# Altium integrated library Integrated_jp.IntLib: 203 symbols (part 1 of 2) (continued)
## Header 5X2_2
designator P?  Supplier Part Number 1: S6105-ND
10 Position Header Connector 0.100" (2.54mm) Through Hole Tin; LatestRevisionDate: 17-Jul-2002; LatestRevisionNote: Re-released for DXP Platform.; Publisher: Altium Limited; Supplier 1: Digi-Key; ComponentLink1Description: CONN HDR 10POS 0.1 TIN PCB; ComponentLink1URL: https://www.digikey.com/es/products/detail/PPTC052LFBN-RC/S6105-ND/807243?utm_campaign=buynow&utm_medium=aggregator&curr=usd&utm_source=octopart; Link: https://www.digikey.com/es/products/detail/PPTC052LFBN-RC/S6105-ND/807243?utm_campaign=buynow&utm_medium=aggregator&curr=usd&utm_source=octopart; Digi-Key_Part_Number: S6105-ND
signal-integrity model Connector
footprint HDR2X5 (Connector; Header; 5x2 Position)
pins: 1, 2, 3, 4, 5, 6, 7, 8, 9, 10

## Header 6
designator P?  Supplier Part Number 1: 455-2271-ND
Cabezal de conector Orificio pasante 6 posiciones 0.098" (2.50mm); Manufacturer: JST; Manufacturer Part Number: B6BXHA(LF)(SN); Contact Resistance: 20mR; Current Rating: 3A; Voltage Rating (AC): 250V; Number of Positions: 6; Insulation Resistance: 1GR; Connector Type: Male Pin; Wire/Cable Gauge: 22AWG; Pitch: 2.5mm; LatestRevisionDate: 17-Jul-2002; LatestRevisionNote: Re-released for DXP Platform.; Publisher: Altium Limited; Supplier 1: Digi-Key; Stock 1: 28709; Pricing 1: 1=0.27, 10=0.258, 100=0.1808, 500=0.15494, 1000=0.12912, 5000=0.11068, 10000=0.1033 (USD); Mount: Through Hole; Contact Plating: Tin,Lead,Copper; Contact Material: Brass; Color: Natural; Housing Color: White; Housing Material: Polyamide; Min Operating Temperature: -25°C; Max Operating Temperature: 85°C; Package Quantity: 500; Packaging: Bulk; Termination: Press-Fit; Number of Rows: 1; Voltage Rating: 250V; Max Current Rating: 3A; Number of Contacts: 6; Max Voltage Rating (AC): 250V; Max Voltage Rating (DC): 250V; Orientation: Straight; Length: 17.4mm; Depth: 5.75mm; Lead Pitch: 2.5mm; REACH SVHC: No SVHC; Lead Free: Lead Free; ComponentLink1URL: https://www.verical.com/server-webapp/html/getDatasheet?partID=424647&src-supplier=Verical; ComponentLink1Description: https://www.verical.com/server-webapp/html/getDatasheet?partID=424647&src-supplier=Verical; ComponentLink2URL: http://www.rapidonline.com/pdf/523653.pdf?src-supplier=Rapid+Electronics; ComponentLink2Description: http://www.rapidonline.com/pdf/523653.pdf?src-supplier=Rapid+Electronics; ComponentLink3URL: https://www.verical.com/server-webapp/html/getDatasheet?partID=641012&src-supplier=Verical; ComponentLink3Description: https://www.verical.com/server-webapp/html/getDatasheet?partID=641012&src-supplier=Verical; ComponentLink4URL: http://www1.futureelectronics.com/doc/JST/B6B-XH-A(LF)(SN).pdf?src-supplier=Future+Electronics; ComponentLink4Description: http://www1.futureelectronics.com/doc/JST/B6B-XH-A(LF)(SN).pdf?src-supplier=Future+Electronics; ComponentLink5URL: http://www.jst-mfg.com/product/pdf/eng/eXH.pdf?src-supplier=Digi-Key; ComponentLink5Description: http://www.jst-mfg.com/product/pdf/eng/eXH.pdf?src-supplier=Digi-Key; Digi_Key_Part_Number: 455-2271-ND; Link: https://www.digikey.com/es/products/detail/B6B-XH-A(LF)(SN)/455-2271-ND/1000381?utm_campaign=buynow&utm_medium=aggregator&curr=usd&utm_source=octopart; ComponentLink6Description: CONN HEADER VERT 6POS 2.5MM; ComponentLink6URL: https://www.digikey.com/es/products/detail/B6B-XH-A(LF)(SN)/455-2271-ND/1000381?utm_campaign=buynow&utm_medium=aggregator&curr=usd&utm_source=octopart; ComponentLink7Description: CONN HEADER VERT 6POS 2.5MM; ComponentLink7URL: https://www.digikey.com/es/products/detail/jst-sales-america-inc/B6B-XH-A-LF-SN/1000381
footprint HDR1X6 (Connector; Header; 6 Position)
pins: 1, 2, 3, 4, 5, 6

## Header 6X2H
designator P?
Header, 6-Pin, Dual row, Right Angle; LatestRevisionDate: 17-Jul-2002; LatestRevisionNote: Re-released for DXP Platform.; Publisher: Altium Limited
footprint HDR2X6_CEN (Connector; Header; 6x2 Position)
pins: 1, 2, 3, 4, 5, 6, 7, 8, 9, 10, 11, 12

## Header 7X2
designator P?
Header, 7-Pin, Dual row; LatestRevisionDate: 17-Jul-2002; LatestRevisionNote: Re-released for DXP Platform.; Publisher: Altium Limited
signal-integrity model Connector
footprint HDR2X7 (Connector; Header; 7x2 Position)
pins: 1, 2, 3, 4, 5, 6, 7, 8, 9, 10, 11, 12, 13, 14

## HEADER 8X2
designator J?
footprint DISPLAY_BL
pins: 1, 2, 3, 4, 5, 6, 7, 8, 9, 10, 11, 12, 13, 14, 15, 16

## Header 9X2
designator P?
Header, 9-Pin, Dual row; LatestRevisionDate: 17-Jul-2002; LatestRevisionNote: Re-released for DXP Platform.; Publisher: Altium Limited
footprint IDC-2X9
pins: 1, 2, 3, 4, 5, 6, 7, 8, 9, 10, 11, 12, 13, 14, 15, 16, 17, 18

## Header 10
designator P?
10 Position Header Connector 0.079" (2.00mm) Through Hole Gold; Digi_Key_Part_Number: S5751-10-ND; LatestRevisionDate: 17-Jul-2002; LatestRevisionNote: Re-released for DXP Platform.; Publisher: Altium Limited; Link: https://www.digikey.com/en/products/detail/sullins-connector-solutions/NPPN101BFCN-RC/804812; ComponentLink1Description: CONN HDR 10POS 0.079 GOLD PCB; ComponentLink1URL: https://www.digikey.com/es/products/detail/sullins-connector-solutions/NPPN101BFCN-RC/804812?s=N4IgTCBcDaIMoFcA2SCWA7AzgAgMIHt10BTAYwBd8AnbAOQAV7aBGABmYCEAxXWgWgBKuEAF0AvkA
signal-integrity model Connector
footprint RHDR10W55P0X200_1X10_2050X240X440P
pins: 1, 2, 3, 4, 5, 6, 7, 8, 9, 10

## Header 15X2
designator P?  Supplier Part Number 1: S7118-ND
30 Position Header Connector 0.100" (2.54mm) Through Hole GoldCONN HDR 30POS 0.1 GOLD PCB; LatestRevisionDate: 17-Jul-2002; LatestRevisionNote: Re-released for DXP Platform.; Publisher: Altium Limited; Supplier 1: Digi-Key; ComponentLink1Description: CONN HDR 30POS 0.1 GOLD PCB; ComponentLink1URL: https://www.digikey.com/es/products/detail/PPPC152LFBN-RC/S7118-ND/810254?utm_campaign=buynow&utm_medium=aggregator&curr=usd&utm_source=octopart; Digi-Key_Part_Number: S7118-ND; Link: https://www.digikey.com/es/products/detail/PPPC152LFBN-RC/S7118-ND/810254?utm_campaign=buynow&utm_medium=aggregator&curr=usd&utm_source=octopart
footprint HDR2X15 (Connector; Header; 15x2 Position)
signal-integrity model Connector
pins: 1, 2, 3, 4, 5, 6, 7, 8, 9, 10, 11, 12, 13, 14, 15, 16, 17, 18, 19, 20, 21, 22, 23, 24, 25, 26, 27, 28, 29, 30

## HEADER 16
designator J?
pins: 1, 2, 3, 4, 5, 6, 7, 8, 9, 10, 11, 12, 13, 14, 15, 16

## Header-2
designator J?
MP: 3-647295-2; Package: None; Price: None; Value: *; Availability: Unavailable
footprint header-2
pins: 1, 2

## INDUCTOR 100UH
designator L?, comment Manufacturer: Eaton Cooper  Manufacturer Part Number: DR1030-101-R  Supplier Part Number 1: 513-1323-6-ND  (hidden comment: 513-1323-1-ND)
100 µH Shielded Drum Core, Wirewound Inductor 860 mA 450mOhm Max Nonstandard; Core Material: Ferrite; Current Rating: 860mA; Saturation Current: 1.05A; Tolerance: 30%; Inductance: 100uH; DC Resistance (DCR): 450mR; Test Frequency: 100kHz; Self Resonant Frequency: 1MHz; Mount: Surface Mount; Case/Package: Nonstandard; Number of Pins: 2; Weight: 0.17637oz; Min Operating Temperature: -40°C; Max Operating Temperature: 125°C; Package Quantity: 1000; Shielding: Shielded; Packaging: Tape and Reel; Inductance Tolerance: 30%; Composition: Wirewound; Max DC Current: 1.05A; Termination: SMD/SMT; DC Current: 860mA; Military Standard: Not; RMS Current (Irms): 860mA; Length: 10.5mm; Height: 3mm; Width: 0.405inch; Height - Seated (Max): 0.118inch; Depth: 10.3mm; Radiation Hardening: No; REACH SVHC: Unknown; Lead Free: Lead Free; ComponentLink1URL: https://www.verical.com/server-webapp/html/getDatasheet?partID=709220&src-supplier=Verical; ComponentLink1Description: https://www.verical.com/server-webapp/html/getDatasheet?partID=709220&src-supplier=Verical; ComponentLink2URL: http://www.cooperbussmann.com/pdf/c73e479f-f867-4c64-ae26-9c1f23814163.pdf?src-supplier=Element14; ComponentLink2Description: http://www.cooperbussmann.com/pdf/c73e479f-f867-4c64-ae26-9c1f23814163.pdf?src-supplier=Element14; ComponentLink3URL: http://uk.rs-online.com/webdocs/116a/0900766b8116a1a6.pdf?src-supplier=RSComponents; ComponentLink3Description: http://uk.rs-online.com/webdocs/116a/0900766b8116a1a6.pdf?src-supplier=RSComponents; ComponentLink4URL: http://www.farnell.com/datasheets/1910184.pdf?src-supplier=Element14; ComponentLink4Description: http://www.farnell.com/datasheets/1910184.pdf?src-supplier=Element14; ComponentLink5URL: http://www.mouser.com/ds/2/87/Bus_Elx_DS_PM-4132_DR1030-473965.pdf?src-supplier=Mouser; ComponentLink5Description: http://www.mouser.com/ds/2/87/Bus_Elx_DS_PM-4132_DR1030-473965.pdf?src-supplier=Mouser; ComponentLink6URL: http://www.cooperindustries.com/content/dam/public/bussmann/Electronics/Resources/product-datasheets/Bus_Elx_DS_PM-4132_DR1030.pdf?src-supplier=Future+Electronics; ComponentLink6Description: http://www.cooperindustries.com/content/dam/public/bussmann/Electronics/Resources/product-datasheets/Bus_Elx_DS_PM-4132_DR1030.pdf?src-supplier=Future+Electronics; Supplier 1: Digi-Key; Link: https://www.digikey.com/en/products/detail/eaton-electronics-division/DR1030-101-R/1130342?s=N4IgTCBcDaIKwEYDMyxIGwgLoF8g; Digi_Key_Part_Number: 513-1323-1-ND; ComponentLink7Description: FIXED IND 100UH 860MA 450MOHM SM; ComponentLink7URL: https://www.digikey.com/es/products/detail/eaton-electronics-division/DR1030-101-R/1130342?s=N4IgTCBcDaIKwEYDMBaZZUJQOQCIgF0BfIA
footprint bobina
pins: 1, 2

## INDUCTOR  POWER LINE_100/2A_0603
designator L?, comment Supplier 1: Digi-Key  Manufacturer: Eaton Cooper  Manufacturer Part Number: DR1030-101-R  Supplier Part Number 1: 553-BBUP00160808121Y00DKR-ND  (hidden comment: 553-BBUP00160808121Y00CT-ND)
100 Ohms @ 100 MHz 1 Línea de alimentación Perlas de ferrita y astillas 0603 (1608 métrico) 2A 35mOhm; Digi_Key_Part_Number: 399-9608-1-ND; Core Material: Ferrite; Current Rating: 860mA; Saturation Current: 1.05A; Tolerance: 30%; Shielding: Shielded; Inductance: 100uH; DC Resistance (DCR): 450mR; Test Frequency: 100kHz; Self Resonant Frequency: 1MHz; Mount: Surface Mount; Case/Package: Nonstandard; Number of Pins: 2; Weight: 0.17637oz; Min Operating Temperature: -40°C; Max Operating Temperature: 125°C; Package Quantity: 1000; Packaging: Tape and Reel; Inductance Tolerance: 30%; Composition: Wirewound; Max DC Current: 1.05A; Termination: SMD/SMT; DC Current: 860mA; Military Standard: Not; RMS Current (Irms): 860mA; Length: 10.5mm; Height: 3mm; Width: 0.405inch; Height - Seated (Max): 0.118inch; Depth: 10.3mm; Radiation Hardening: No; REACH SVHC: Unknown; Lead Free: Lead Free; ComponentLink1Description: Z0603C121APMST; ComponentLink1URL: https://www.digikey.com/es/products/detail/kemet/Z0603C121APMST/13146939; Link: https://www.digikey.com/es/products/detail/Z0603C101BPWZT/399-9608-1-ND/3674093?utm_campaign=buynow&utm_medium=aggregator&curr=usd&utm_source=octopart
footprint IND-0603 (Inductor 0603(1608))
pins: 1, 2

## INDUCTOR POWER LINE 120 /3A_0603
designator L?, comment BLM18
120 Ohms 1 Ferrite Bead 0603 (1608 Metric) 3A 30mOhm; Digi_Key_Part_Number: 553-BBUP00160808121Y00CT-ND; Value: BLM18; Supplier 1: Digi-Key; Supplier Part Number 1: 399-9608-1-ND; Link: https://www.digikey.com/en/products/detail/pulse-electronics/BBUP00160808121Y00/10508561; ComponentLink1Description: FERRITE BEAD 120 OHM 0603 1LN; ComponentLink1URL: https://www.digikey.com/es/products/detail/pulse-electronics/BBUP00160808121Y00/10508561?s=N4IgTCBcDaIKxwMwFoBCqCqAFADDgjAGw4Acp%2BY%2BAmngMIAqyAcgCIgC6AvkA
footprint SM/C_0603
pins: 1, 2

## IP101GA
designator U3
Single Port 10/100 MII/RMII/TP/Fiber  Fast Ethernet Transceiver
footprint LQFP48(0.5/9.0)
pins: 1 COL/RMII, 2 TXEN, 3 TXD3, 4 TXD2, 5 TXD1, 6 TXD0, 7 TXCLK/50M_CLKI, 8 REGOUT, 9 LED0/PHY_AD0, 10 LED1/PHY_AD1, 11 DGND, 12 LED2/PHY_AD2, 13 LED3/PHY_AD3, 14 VDDIO, 15 NC, 16 RXCLK/50M_CLKO, 17 DGND, 18 RXD3, 19 RXD2, 20 RXD1, 21 RXD0, 22 RXDV/CRS_DV/FX_HEN, 23 CRS/LEDMOD, 24 RXER, 25 MDC, 26 MDIO, 27 TEST_ON, 28 ISET, 29 AGND1V, 30 MDI_RN, 31 MDI_RP, 32 NC, 33 MDI_TN, 34 MDI_TP, 35 AGND33, 36 AVDD33, 37 NC, 38 NC, 39 NC, 40 NC, 41 NC, 42 RESET_N, 43 TXER/FXSD, 44 NC, 45 DGND, 46 X1, 47 X2, 48 INTR

## IRF530N/TO_0_1
designator Q?  Supplier Part Number 1: IRF530STRLPBFDKR-ND
Canal N Montaje en superficie 100V 14 A (Tc) 3.7W (Ta), 88W (Tc) D2PAK; Manufacturer: Vishay Siliconix; Manufacturer Part Number: IRF530STRLPBF; Rise Time: 34ns; Rds On Max: 160mR; Input Capacitance: 670pF; Nominal Vgs: 2V; Continuous Drain Current (ID): 14A; Gate to Source Voltage (Vgs): 20V; Fall Time: 24ns; Turn-Off Delay Time: 23ns; Turn-On Delay Time: 10ns; Number of Elements: 1; Element Configuration: Single; Supplier 1: Digi-Key; Stock 1: 843; Pricing 1: 1=1.62, 10=1.453, 100=1.0689 (USD); Mount: Surface Mount; Case/Package: TO-263-3; Number of Pins: 3; Weight: 0.068654oz; Min Operating Temperature: -55°C; Max Operating Temperature: 175°C; Packaging: Tape and Reel; Package Quantity: 800; Drain to Source Voltage (Vdss): 100V; Max Power Dissipation: 3.7W; Drain to Source Breakdown Voltage: 100V; Drain to Source Resistance: 160mR; Power Dissipation: 3.7W; Number of Channels: 1; Length: 10.67mm; Height: 4.83mm; Width: 9.65mm; Radiation Hardening: No; REACH SVHC: Unknown; ComponentLink1URL: http://www.vishay.com/docs/91020/sihf530s.pdf?src-supplier=Avnet+Europe; ComponentLink1Description: http://www.vishay.com/docs/91020/sihf530s.pdf?src-supplier=Avnet+Europe; ComponentLink2URL: http://www.mouser.com/ds/2/427/sihf530s-896361.pdf?src-supplier=Mouser; ComponentLink2Description: http://www.mouser.com/ds/2/427/sihf530s-896361.pdf?src-supplier=Mouser; ComponentLink3URL: http://www.vishay.com/docs/91020/sihf530s.pdf?src-supplier=Digi-Key; ComponentLink3Description: http://www.vishay.com/docs/91020/sihf530s.pdf?src-supplier=Digi-Key
footprint TO263 - mosfet
pins: 1, 2, 3

## IRFR210TRPBF
designator Q?  Supplier Part Number 1: IRFR210PBFDKR-ND
Canal N Montaje en superficie 200V 2.6 A (Tc) 2.5W (Ta), 25W (Tc) D-Pak; Manufacturer: Vishay; Manufacturer Part Number: IRFR210TRPBF; Rds On Max: 1.5R; Input Capacitance: 140pF; Rise Time: 17ns; Continuous Drain Current (ID): 2.6A; Gate to Source Voltage (Vgs): 20V; Fall Time: 8.9ns; Turn-Off Delay Time: 14ns; Turn-On Delay Time: 8.2ns; Number of Elements: 1; Element Configuration: Single; Supplier 1: Digi-Key; Stock 1: 584; Pricing 1: 1=0.91, 10=0.81, 100=0.5769, 500=0.48896, 1000=0.39832 (USD); Mount: Surface Mount; Case/Package: DPAK; Number of Pins: 3; Weight: 0.050717oz; Contact Plating: Tin,Matte; Min Operating Temperature: -55°C; Max Operating Temperature: 150°C; Package Quantity: 1; Packaging: Tape and Reel; Drain to Source Voltage (Vdss): 200V; Max Power Dissipation: 2.5W; Drain to Source Breakdown Voltage: 200V; Drain to Source Resistance: 1.5R; Power Dissipation: 2.5W; Number of Channels: 1; On-State Resistance: 1.5R; Length: 6.73mm; Height: 2.39mm; Width: 6.22mm; Radiation Hardening: No; Lead Free: Lead Free; ComponentLink1URL: http://www.mouser.com/ds/2/427/sihfr210-61757.pdf?src-supplier=Mouser; ComponentLink1Description: http://www.mouser.com/ds/2/427/sihfr210-61757.pdf?src-supplier=Mouser; ComponentLink2URL: http://www.vishay.com/docs/91268/sihfr210.pdf?src-supplier=Digi-Key; ComponentLink2Description: http://www.vishay.com/docs/91268/sihfr210.pdf?src-supplier=Digi-Key; ComponentLink3URL: http://www.vishay.com/docs/91268/sihfr210.pdf?src-supplier=Future+Electronics; ComponentLink3Description: http://www.vishay.com/docs/91268/sihfr210.pdf?src-supplier=Future+Electronics
footprint TO252AB/DPAK
pins: 1, 2, 3

## ISO3082DWR
designator U?  Supplier Part Number 1: 296-37891-6-ND  Supplier Part Number 2: 296-37891-1-ND
200-Kbps, half-duplex, 2.5-kVrms isolated RS-485 & RS-422 transceiver; MF: Texas Instruments; Value: ISO3082DWR; Purchase-URL: https://pricing.snapeda.com/search/part/ISO3082DWR/?ref=eda; Package: SOIC-16 Texas Instruments; SnapEDA_Link: https://www.snapeda.com/parts/ISO3082DWR/Texas+Instruments/view-part/?ref=snap; Check_prices: https://www.snapeda.com/parts/ISO3082DWR/Texas+Instruments/view-part/?ref=eda; Price: None; MP: ISO3082DWR; Availability: In Stock; Supplier 1: Digi-Key; Supplier 2: Digi-Key; Digi_Key_Part_Number: 296-37891-1-ND; Link: https://www.digikey.com/es/products/detail/ISO3082DWR/296-37891-6-ND/4899999?utm_campaign=buynow&utm_medium=aggregator&curr=usd&utm_source=octopart; ComponentLink1Description: ISO RS485/422 0.2MBPS 2.5KVRMS; ComponentLink1URL: https://www.digikey.com/es/products/detail/texas-instruments/ISO3082DWR/1898638
footprint SOIC127P1030X265-16N
pins: 1 VCC1 (power), 2 GND1 (power), 3 R (out), 4 ~{RE} (in), 5 DE (in), 6 D (in), 7 GND1 (power), 8 GND1 (power), 9 GND2 (power), 10 GND2 (power), 11 NC, 12 A (io), 13 B (io), 14 NC, 15 GND2 (power), 16 VCC2 (power)

## IXDD604SIATR
designator U?  Supplier Part Number 1: 212-IXDD604SIADKR-ND
Nivel bajo Gate Driver IC No inversor 8-SOIC; Manufacturer: Ixys Clare; Manufacturer Part Number: IXDD604SIATR; Rise Time: 9ns; Max Supply Voltage: 35V; Min Supply Voltage: 4.5V; Output Current: 4A; Number of Outputs: 2; Propagation Delay: 50ns; Fall Time: 8ns; Operating Supply Current: 10uA; Supplier 1: Digi-Key; Stock 1: 2000; Pricing 1: 1=1.76, 10=1.583, 25=1.4936, 100=1.1948, 250=1.04544, 500=1.01558, 1000=0.80649 (USD); Mount: Surface Mount; Case/Package: SOIC; Number of Pins: 8; Weight: 0.019048oz; Min Operating Temperature: -40°C; Max Operating Temperature: 125°C; Packaging: Tape and Reel; Package Quantity: 2000; Max Output Current: 4A; Number of Drivers: 2; Lead Free: Lead Free; ComponentLink1URL: http://www.ixysic.com/home/pdfs.nsf/www/IXD_604.pdf/file/IXD_604.pdf?src-supplier=Digi-Key; ComponentLink1Description: http://www.ixysic.com/home/pdfs.nsf/www/IXD_604.pdf/file/IXD_604.pdf?src-supplier=Digi-Key
footprint *SOIC127P600X134-8N
pins: GND 3 (power), INA 2, INB 4, OUTA 7, OUTB 5, VCC 6 (power)

## Jumper
designator W?, comment S9342-ND
2 (1 x 2) Conector de derivación de posiciones Parte superior abierta 0.100" (2.54mm) Oro; Published: 24-Mar-1999; LatestRevisionDate: 17-Jul-2002; LatestRevisionNote: Re-released for DXP Platform.; PackageReference: RAD-0.2; Publisher: Altium Limited; PackageDescription: Radial Cap, Thru-Hole; 2 Leads; 0.2 in Pin Spacing; Supplier 1: Digi-Key; Link: https://www.digikey.com/es/products/detail/SPC02SXCN-RC/S9342-ND/2618267?utm_campaign=buynow&utm_medium=aggregator&curr=usd&utm_source=octopart; Digi_Key_Part_Number: S9342-ND; ComponentLink1Description: CONN JUMPER SHORTING .100" GOLD; ComponentLink1URL: https://www.digikey.com/es/products/detail/sullins-connector-solutions/SPC02SXCN-RC/2618267?s=N4IgTCBcDaIMoE4DMAWMBaAcgERAXQF8g; Supplier Part Number 1: S9342-ND
footprint RAD-0.2 (Radial Cap, Thru-Hole; 2 Leads; 0.2 in Pin Spacing)
pins: 1 C1, 2 C2

## keypad_ProID
designator P?
Header, 8-Pin; LatestRevisionDate: 17-Jul-2002; LatestRevisionNote: Re-released for DXP Platform.; Publisher: Altium Limited
footprint keypad (Connector; Header; 8 Position)
pins: 1 RED_+DC, 2 BLACK_GND, 3 GREEN_D0, 4 WHITE_D1, 5 GREY_LED, 6 YELLOW_WG34/CONNECT TO GND, 7 PURPLE_BEEPER, 8

## KL-CWXM04
designator RF?  Supplier Part Number 1: 455-2271-ND
RF super heterodyne 315mhz rf wireless transmitter and receiver KL-CWXM04-Pin; Manufacturer: JST; Manufacturer Part Number: B6BXHA(LF)(SN); Contact Resistance: 20mR; Current Rating: 3A; Voltage Rating (AC): 250V; Number of Positions: 6; Insulation Resistance: 1GR; Connector Type: Male Pin; Wire/Cable Gauge: 22AWG; Pitch: 2.5mm; LatestRevisionDate: 17-Jul-2002; LatestRevisionNote: Re-released for DXP Platform.; Publisher: Altium Limited; Supplier 1: Digi-Key; Stock 1: 28709; Pricing 1: 1=0.27, 10=0.258, 100=0.1808, 500=0.15494, 1000=0.12912, 5000=0.11068, 10000=0.1033 (USD); Mount: Through Hole; Contact Plating: Tin,Lead,Copper; Contact Material: Brass; Color: Natural; Housing Color: White; Housing Material: Polyamide; Min Operating Temperature: -25°C; Max Operating Temperature: 85°C; Package Quantity: 500; Packaging: Bulk; Termination: Press-Fit; Number of Rows: 1; Voltage Rating: 250V; Max Current Rating: 3A; Number of Contacts: 6; Max Voltage Rating (AC): 250V; Max Voltage Rating (DC): 250V; Orientation: Straight; Length: 17.4mm; Depth: 5.75mm; Lead Pitch: 2.5mm; REACH SVHC: No SVHC; Lead Free: Lead Free; ComponentLink1URL: https://www.verical.com/server-webapp/html/getDatasheet?partID=424647&src-supplier=Verical; ComponentLink1Description: https://www.verical.com/server-webapp/html/getDatasheet?partID=424647&src-supplier=Verical; ComponentLink2URL: http://www.rapidonline.com/pdf/523653.pdf?src-supplier=Rapid+Electronics; ComponentLink2Description: http://www.rapidonline.com/pdf/523653.pdf?src-supplier=Rapid+Electronics; ComponentLink3URL: https://www.verical.com/server-webapp/html/getDatasheet?partID=641012&src-supplier=Verical; ComponentLink3Description: https://www.verical.com/server-webapp/html/getDatasheet?partID=641012&src-supplier=Verical; ComponentLink4URL: http://www1.futureelectronics.com/doc/JST/B6B-XH-A(LF)(SN).pdf?src-supplier=Future+Electronics; ComponentLink4Description: http://www1.futureelectronics.com/doc/JST/B6B-XH-A(LF)(SN).pdf?src-supplier=Future+Electronics; ComponentLink5URL: http://www.jst-mfg.com/product/pdf/eng/eXH.pdf?src-supplier=Digi-Key; ComponentLink5Description: http://www.jst-mfg.com/product/pdf/eng/eXH.pdf?src-supplier=Digi-Key
footprint HDR1X7 (Connector; Header; 6 Position)
pins: 1 VCC, 2 VT, 3 GND, 4 D3, 5 D2, 6 D1, 7 D0

## LED BI-COLOUR
designator D?  Supplier Part Number 1: 754-1221-ND
Manufacturer: Kingbright; Manufacturer Part Number: WP3VEGW; Color: Green,Red; Lens Color: White; Luminous Intensity: 40mcd; Viewing Angle: 60°; Lens Style: Dome,Diffused,Round; Forward Voltage: 2V; Dominant Wavelength: 625nm; Test Current: 20mA; Supplier 1: Digi-Key; Stock 1: 32286; Pricing 1: 1=0.58, 10=0.417, 100=0.272, 500=0.1955, 1000=0.153, 2500=0.14025, 5000=0.1275, 10000=0.119, 25000=0.11475 (USD); Mount: Through Hole; Case/Package: Radial; Number of Pins: 1; Min Operating Temperature: -40°C; Max Operating Temperature: 85°C; Package Quantity: 500; Packaging: Bulk; Illumination Color: Green,Red; Height: 5mm; Width: 4mm; Lead Free: Lead Free; ComponentLink1URL: http://www.us.kingbright.com/images/catalog/SPEC/WP3VEGW.pdf?src-supplier=Future+Electronics; ComponentLink1Description: http://www.us.kingbright.com/images/catalog/SPEC/WP3VEGW.pdf?src-supplier=Future+Electronics; ComponentLink2URL: http://www.mouser.com/ds/2/216/WP3VEGW-47873.pdf?src-supplier=Mouser; ComponentLink2Description: http://www.mouser.com/ds/2/216/WP3VEGW-47873.pdf?src-supplier=Mouser; ComponentLink3URL: http://www.kingbrightusa.com/images/catalog/SPEC/WP3VEGW.pdf?src-supplier=Digi-Key; ComponentLink3Description: http://www.kingbrightusa.com/images/catalog/SPEC/WP3VEGW.pdf?src-supplier=Digi-Key
footprint LED BI-COLOUR
pins: 1, 2, 3

## LED BI-COLOUR_SMD
designator D?, comment 160-1409-1-ND  Supplier Part Number 1: 160-1409-6-ND
Verde, rojo Verde de 571nm, rojo de 631nm Indicación led: discreta Verde de 2V, rojo de 2V 1210 (3225 métrico); Manufacturer: Kingbright; Manufacturer Part Number: WP3VEGW; Color: Green,Red; Lens Color: White; Luminous Intensity: 40mcd; Viewing Angle: 60°; Lens Style: Dome,Diffused,Round; Dominant Wavelength: 625nm; Test Current: 20mA; Mount: Through Hole; Case/Package: Radial; Number of Pins: 1; Min Operating Temperature: -40°C; Max Operating Temperature: 85°C; Package Quantity: 500; Packaging: Bulk; Forward Voltage: 2V; Illumination Color: Green,Red; Height: 5mm; Width: 4mm; Lead Free: Lead Free; Supplier 1: Digi-Key; ComponentLink2Description: LED GREEN/RED CLEAR CHIP SMD; ComponentLink2URL: https://www.digikey.com/es/products/detail/liteon/LTST-C155KGJRKT/386767?s=N4IgTCBcDaIIwDYAMBaOAWJBONKByAIiALoC%2BQA; Digi-Key_Part_Number: 160-1409-1-ND; Link: https://www.digikey.com/es/products/detail/liteon/LTST-C155KGJRKT/386767?s=N4IgTCBcDaIIwDYAMBaOAWJBONKByAIiALoC%2BQA
footprint LED_LTST-C155GEKT
pins: 1, 2, 3, 4

## LED_3mm
designator D?
footprint LED 3mm
pins: 1, 2

## LED_ROJO_1206
designator D?, comment Supplier Part Number 1: SML-LXL1206SRC-TR-ND  (hidden comment: 67-2299-1-ND)
Rojo Indicación led: discreta 1.7V 1206 (3216 métrico); Value: LED RED; Supplier 1: Digi-Key; Link: https://www.digikey.com/es/products/detail/lumex-opto-components-inc/SML-LXL1206SRC-TR/515910?s=N4IgTCBcDaIGwHYC0YwE41IIxIHIBEQBdAXyA; Digi_Key_Part_Number: 67-2299-1-ND; ComponentLink1Description: LED RED CLEAR 1206 SMD; ComponentLink1URL: https://www.digikey.com/es/products/detail/lumex-opto-components-inc/SML-LXL1206SRC-TR/515910?s=N4IgTCBcDaIGwHYC0YwE41IIxIHIBEQBdAXyA
footprint SM/D_0805_21_led
pins: 1, 2

## LED_VERDE_1206
designator D?, comment Supplier Part Number 1: 160-1404-6-ND  (hidden comment: 160-1404-1-ND)
Verde 571nm Indicación led: discreta 2V 1206 (3216 métrico); Value: LED GREEN; Supplier 1: Digi-Key; Digi_Key_Part_Number: 160-1404-1-ND; Link: https://www.digikey.com/es/products/detail/liteon/LTST-C150KGKT/365085?s=N4IgTCBcDaIIwDYAMBaOAWJ60oHIBEQBdAXyA; ComponentLink1Description: LED GREEN CLEAR 1206 SMD; ComponentLink1URL: https://www.digikey.com/es/products/detail/liteon/LTST-C150KGKT/365085?s=N4IgTCBcDaIIwDYAMBaOAWJ60oHIBEQBdAXyA
footprint SM/D_0805_21_led - VERDE
pins: 1, 2

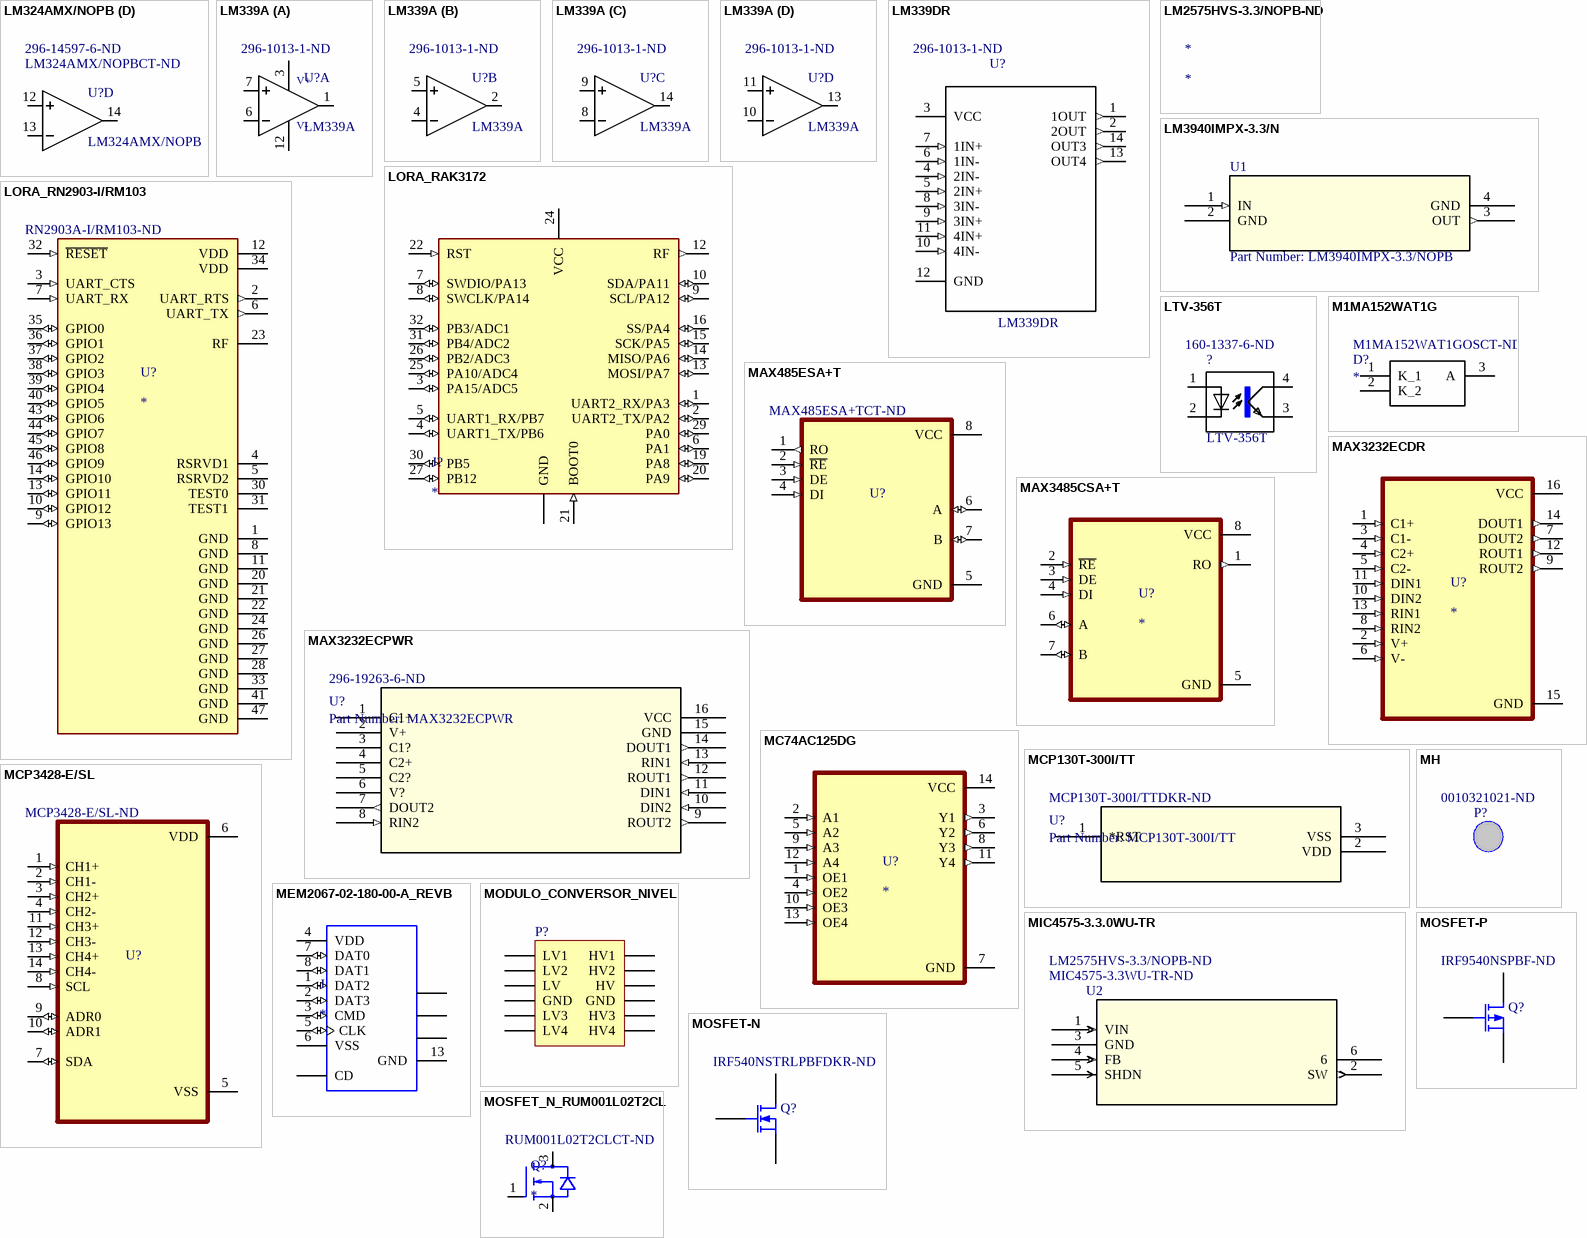
[diagram p4: symbols LM324AMX/NOPB to MOSFET_N_RUM001L02T2CL]

## LM324AMX/NOPB
designator U?  Supplier Part Number 1: LM324AMX/NOPBCT-ND  Supplier Part Number 2: 296-14597-6-ND
Low Power Quad Operational Amplifier 14-SOIC 0 to 70; Manufacturer: TI National Semiconductor; MF: Texas Instruments; Min Dual Supply Voltage: 1.5V; Slew Rate: 0.5V/µs; Min Supply Voltage: 3V; Max Supply Voltage: 32V; Max Dual Supply Voltage: 16V; Voltage Gain: 100dB; Max Power Dissipation: 800mW; Unity Gain Bandwidth Product: 1MHz; Common Mode Rejection Ratio: 65dB; Number of Channels: 4; Output Current: 40mA; Input Offset Voltage (Vos): 3mV; Input Bias Current: 100nA; Max Supply Current: 1.2mA; Nominal Supply Current: 1.5mA; Operating Supply Current: 1.4mA; Output Current per Channel: 60mA; Digi-Key_Purchase_URL: https://www.digikey.com/product-detail/en/texas-instruments/LM324AMX-NOPB/LM324AMX-NOPBCT-ND/1010531?utm_source=snapeda&utm_medium=aggregator&utm_campaign=symbol; Digi-Key_Part_Number: LM324AMX/NOPBCT-ND; MP: LM324AMX/NOPB; Package: SOIC-14 Texas Instruments; SnapEDA_Link: https://www.snapeda.com/parts/LM324AMX/NOPB/Texas%20Instruments/view-part/?ref=snap; Value: *; Supplier 1: Digi-Key; Manufacturer Part Number: LM324AMX/NOPB; Stock 1: 86609; Pricing 1: 1=1.05, 10=0.936, 100=0.7297, 500=0.60276, 1000=0.47586 (USD); Mount: Surface Mount; Case/Package: SOIC; Number of Pins: 14; Min Operating Temperature: 0°C; Max Operating Temperature: 70°C; Packaging: Tape and Reel; Operating Supply Voltage: 16V; Dual Supply Voltage: 3V; Bandwidth: 1MHz; Gain Bandwidth Product: 1MHz; Number of Amplifiers: 4; Power Supply Rejection Ratio (PSRR): 65dB; Number of Elements: 4; Power Dissipation: 800mW; Package Quantity: 2500; Number of Circuits: 4; Length: 8.64mm; Height: 1.45mm; Width: 3.91mm; Radiation Hardening: No; REACH SVHC: No SVHC; Lead Free: Lead Free; ComponentLink1URL: http://www.jameco.com/Jameco/Products/ProdDS/1267647.pdf?src-supplier=Jameco; ComponentLink1Description: http://www.jameco.com/Jameco/Products/ProdDS/1267647.pdf?src-supplier=Jameco; ComponentLink2URL: http://www.ti.com/lit/ds/symlink/lm124-n.pdf?src-supplier=Avnet; ComponentLink2Description: http://www.ti.com/lit/ds/symlink/lm124-n.pdf?src-supplier=Avnet; ComponentLink3URL: http://www.ti.com/lit/ds/symlink/lm124-n.pdf?src-supplier=Digi-Key; ComponentLink3Description: http://www.ti.com/lit/ds/symlink/lm124-n.pdf?src-supplier=Digi-Key; ComponentLink4URL: http://www.farnell.com/datasheets/2001690.pdf?src-supplier=Farnell; ComponentLink4Description: http://www.farnell.com/datasheets/2001690.pdf?src-supplier=Farnell; Supplier 2: Digi-Key; Stock 2: 13590; Pricing 2: 1=0.4, 10=0.302, 100=0.1483, 500=0.12854, 1000=0.09888 (USD); Contact Plating: Gold; ComponentLink5URL: http://www.ti.com/general/docs/lit/getliterature.tsp?genericPartNumber=LM124&&fileType=pdf&src-supplier=Avnet; ComponentLink5Description: http://www.ti.com/general/docs/lit/getliterature.tsp?genericPartNumber=LM124&&fileType=pdf&src-supplier=Avnet; ComponentLink6URL: http://www.farnell.com/datasheets/1840878.pdf?src-supplier=Element14; ComponentLink6Description: http://www.farnell.com/datasheets/1840878.pdf?src-supplier=Element14; ComponentLink7URL: http://www.farnell.com/datasheets/1877076.pdf?src-supplier=Element14; ComponentLink7Description: http://www.farnell.com/datasheets/1877076.pdf?src-supplier=Element14; ComponentLink8URL: http://www.ti.com/lit/ds/symlink/lm224.pdf?src-supplier=Digi-Key; ComponentLink8Description: http://www.ti.com/lit/ds/symlink/lm224.pdf?src-supplier=Digi-Key; ComponentLink9URL: http://www.jameco.com/Jameco/Products/ProdDS/902590.pdf?src-supplier=Jameco; ComponentLink9Description: http://www.jameco.com/Jameco/Products/ProdDS/902590.pdf?src-supplier=Jameco; ComponentLink10URL: http://www.farnell.com/datasheets/1768103.pdf?src-supplier=Farnell; ComponentLink10Description: http://www.farnell.com/datasheets/1768103.pdf?src-supplier=Farnell
footprint SOIC127P600X175-14N
part A pins: 1, 2, 3, 4 (power), 11 (power)
part B pins: 5, 6, 7
part C pins: 8, 9, 10
part D pins: 12, 13, 14
part A text: V+; V-

## LM339A
designator U?  Supplier Part Number 1: 296-1013-1-ND
Low Power Quad Operational Amplifier 14-SOIC 0 to 70; Manufacturer Part Number: LM339DR; MF: Texas Instruments; MP: LM324AMX/NOPB; Voltage Gain: 106.02dB; Min Supply Voltage: 2V; Max Supply Voltage: 30V; Min Dual Supply Voltage: 1V; Max Dual Supply Voltage: 15V; Nominal Supply Current: 2mA; Number of Elements: 4; Max Supply Current: 500uA; Input Bias Current: 250nA; Output Current per Channel: 6mA; Input Offset Voltage (Vos): 5mV; Response Time: 1.3us; Output Current: 20mA; Quiescent Current: 2.5mA; Output Type: TTL; Digi-Key_Purchase_URL: https://www.digikey.com/product-detail/en/texas-instruments/LM324AMX-NOPB/LM324AMX-NOPBCT-ND/1010531?utm_source=snapeda&utm_medium=aggregator&utm_campaign=symbol; Digi-Key_Part_Number: LM324AMX/NOPBCT-ND; Package: SOIC-14 Texas Instruments; SnapEDA_Link: https://www.snapeda.com/parts/LM324AMX/NOPB/Texas%20Instruments/view-part/?ref=snap; Value: *; Supplier 1: Digi-Key; Manufacturer: Texas Instruments; Stock 1: 19352; Pricing 1: 1=0.39, 10=0.295, 100=0.1452, 500=0.12586, 1000=0.09682 (USD); Mount: Surface Mount; Case/Package: SOIC; Number of Pins: 14; Weight: 0.004318oz; Contact Plating: Gold; Min Operating Temperature: 0°C; Max Operating Temperature: 70°C; Packaging: Tape and Reel; Package Quantity: 2500; Number of Channels: 4; Max Input Current: 250nA; Radiation Hardening: No; Lead Free: Lead Free; REACH SVHC: No SVHC; ComponentLink1URL: http://www.ti.com/lit/ds/symlink/lm139a.pdf?src-supplier=Avnet; ComponentLink1Description: http://www.ti.com/lit/ds/symlink/lm139a.pdf?src-supplier=Avnet; ComponentLink2URL: https://www.verical.com/server-webapp/html/getDatasheet?partID=242797&src-supplier=Verical; ComponentLink2Description: https://www.verical.com/server-webapp/html/getDatasheet?partID=242797&src-supplier=Verical; ComponentLink3URL: http://www.farnell.com/datasheets/1874704.pdf?src-supplier=Element14; ComponentLink3Description: http://www.farnell.com/datasheets/1874704.pdf?src-supplier=Element14; ComponentLink4URL: http://www.ti.com/general/docs/lit/getliterature.tsp?genericPartNumber=LM339&&fileType=pdf&src-supplier=Element14; ComponentLink4Description: http://www.ti.com/general/docs/lit/getliterature.tsp?genericPartNumber=LM339&&fileType=pdf&src-supplier=Element14; ComponentLink5URL: http://www.ti.com/lit/ds/symlink/lm139a.pdf?src-supplier=Digi-Key; ComponentLink5Description: http://www.ti.com/lit/ds/symlink/lm139a.pdf?src-supplier=Digi-Key; ComponentLink6URL: http://www.jameco.com/Jameco/Products/ProdDS/902741.pdf?src-supplier=Jameco; ComponentLink6Description: http://www.jameco.com/Jameco/Products/ProdDS/902741.pdf?src-supplier=Jameco; ComponentLink7URL: http://www.ti.com/general/docs/lit/getliterature.tsp?genericPartNumber=LM339&amp;&amp;fileType=pdf&src-supplier=Avnet+Asia; ComponentLink7Description: http://www.ti.com/general/docs/lit/getliterature.tsp?genericPartNumber=LM339&amp;&amp;fileType=pdf&src-supplier=Avnet+Asia; ComponentLink8URL: http://www.produktinfo.conrad.com/datenblaetter/1000000-1099999/001072944-da-01-en-IC_QUAD_DIFF_COMP_LM339DR_SOIC_14_TID.pdf?src-supplier=Conrad; ComponentLink8Description: http://www.produktinfo.conrad.com/datenblaetter/1000000-1099999/001072944-da-01-en-IC_QUAD_DIFF_COMP_LM339DR_SOIC_14_TID.pdf?src-supplier=Conrad
footprint SOIC127P600X175-14N
part A pins: 1, 3 (power), 6, 7, 12 (power)
part B pins: 2, 4, 5
part C pins: 8, 9, 14
part D pins: 10, 11, 13
part A text: V+; V-

## LM339DR
designator U?  Supplier Part Number 1: 296-1013-1-ND
Comparator; differential; 2Ã·36VDC; Channels: 4; SMD; SO1; MF: Texas Instruments; Voltage Gain: 106.02dB; Min Supply Voltage: 2V; Max Supply Voltage: 30V; Min Dual Supply Voltage: 1V; Max Dual Supply Voltage: 15V; Nominal Supply Current: 2mA; Number of Elements: 4; Max Supply Current: 500uA; Input Bias Current: 250nA; Output Current per Channel: 6mA; Input Offset Voltage (Vos): 5mV; Response Time: 1.3us; Output Current: 20mA; Quiescent Current: 2.5mA; Output Type: TTL; Digi-Key_Part_Number: LM339DRRS-ND; Digi-Key_Purchase_URL: https://www.digikey.com/product-detail/en/rohm-semiconductor/LM339DR/LM339DRRS-ND/2336957?utm_source=snapeda&utm_medium=aggregator&utm_campaign=symbol; Package: SOIC-14 Texas Instruments; MP: LM339DR; SnapEDA_Link: https://www.snapeda.com/parts/LM339DR/Texas%20Instruments/view-part/?ref=snap; Value: *; Supplier 1: Digi-Key; Manufacturer: Texas Instruments; Manufacturer Part Number: LM339DR; Stock 1: 19352; Pricing 1: 1=0.39, 10=0.295, 100=0.1452, 500=0.12586, 1000=0.09682 (USD); Mount: Surface Mount; Case/Package: SOIC; Number of Pins: 14; Weight: 0.004318oz; Contact Plating: Gold; Min Operating Temperature: 0°C; Max Operating Temperature: 70°C; Packaging: Tape and Reel; Package Quantity: 2500; Number of Channels: 4; Max Input Current: 250nA; Radiation Hardening: No; Lead Free: Lead Free; REACH SVHC: No SVHC; ComponentLink1URL: http://www.ti.com/lit/ds/symlink/lm139a.pdf?src-supplier=Avnet; ComponentLink1Description: http://www.ti.com/lit/ds/symlink/lm139a.pdf?src-supplier=Avnet; ComponentLink2URL: https://www.verical.com/server-webapp/html/getDatasheet?partID=242797&src-supplier=Verical; ComponentLink2Description: https://www.verical.com/server-webapp/html/getDatasheet?partID=242797&src-supplier=Verical; ComponentLink3URL: http://www.farnell.com/datasheets/1874704.pdf?src-supplier=Element14; ComponentLink3Description: http://www.farnell.com/datasheets/1874704.pdf?src-supplier=Element14; ComponentLink4URL: http://www.ti.com/general/docs/lit/getliterature.tsp?genericPartNumber=LM339&&fileType=pdf&src-supplier=Element14; ComponentLink4Description: http://www.ti.com/general/docs/lit/getliterature.tsp?genericPartNumber=LM339&&fileType=pdf&src-supplier=Element14; ComponentLink5URL: http://www.ti.com/lit/ds/symlink/lm139a.pdf?src-supplier=Digi-Key; ComponentLink5Description: http://www.ti.com/lit/ds/symlink/lm139a.pdf?src-supplier=Digi-Key; ComponentLink6URL: http://www.jameco.com/Jameco/Products/ProdDS/902741.pdf?src-supplier=Jameco; ComponentLink6Description: http://www.jameco.com/Jameco/Products/ProdDS/902741.pdf?src-supplier=Jameco; ComponentLink7URL: http://www.ti.com/general/docs/lit/getliterature.tsp?genericPartNumber=LM339&amp;&amp;fileType=pdf&src-supplier=Avnet+Asia; ComponentLink7Description: http://www.ti.com/general/docs/lit/getliterature.tsp?genericPartNumber=LM339&amp;&amp;fileType=pdf&src-supplier=Avnet+Asia; ComponentLink8URL: http://www.produktinfo.conrad.com/datenblaetter/1000000-1099999/001072944-da-01-en-IC_QUAD_DIFF_COMP_LM339DR_SOIC_14_TID.pdf?src-supplier=Conrad; ComponentLink8Description: http://www.produktinfo.conrad.com/datenblaetter/1000000-1099999/001072944-da-01-en-IC_QUAD_DIFF_COMP_LM339DR_SOIC_14_TID.pdf?src-supplier=Conrad
footprint SOIC127P600X175-14N
pins: 1 1OUT (out), 2 2OUT (out), 3 VCC (power), 4 2IN- (in), 5 2IN+ (in), 6 1IN- (in), 7 1IN+ (in), 8 3IN- (in), 9 3IN+ (in), 10 4IN- (in), 11 4IN+ (in), 12 GND, 13 OUT4 (out), 14 OUT3 (out)

## LM2575HVS-3.3/NOPB-ND
designator *

## LM3940IMPX-3.3/N
designator U1, comment Part Number: LM3940IMPX-3.3/NOPB
No Description Available; Vendor: Texas Instruments; Built_By: EMA_UL_Team; Manufacturer_Part_Number: LM3940IMPX-3.3/NOPB; Copyright: Copyright (C) 2018 Accelerated Designs. All rights reserved; RefDes: RefDes; Type: DEV; Value: Value
footprint MP04A
footprint MP04A-M
pins: 1 IN (in), 2 GND, 3 OUT (out), 4 GND